# Altium footprint library Power_Lib_Altium.PcbLib: 383 footprints (part 10 of 24)
Each footprint in its own frame and in the unit in brackets; x right, y up, seen from the top. Pads: shape width x height; smd on the part's side, far side on the other; paste and mask are expansions set on the pad; w line width, h text height; cw(c..) or ccw(c..) is an arc to the next point about the centre after c.
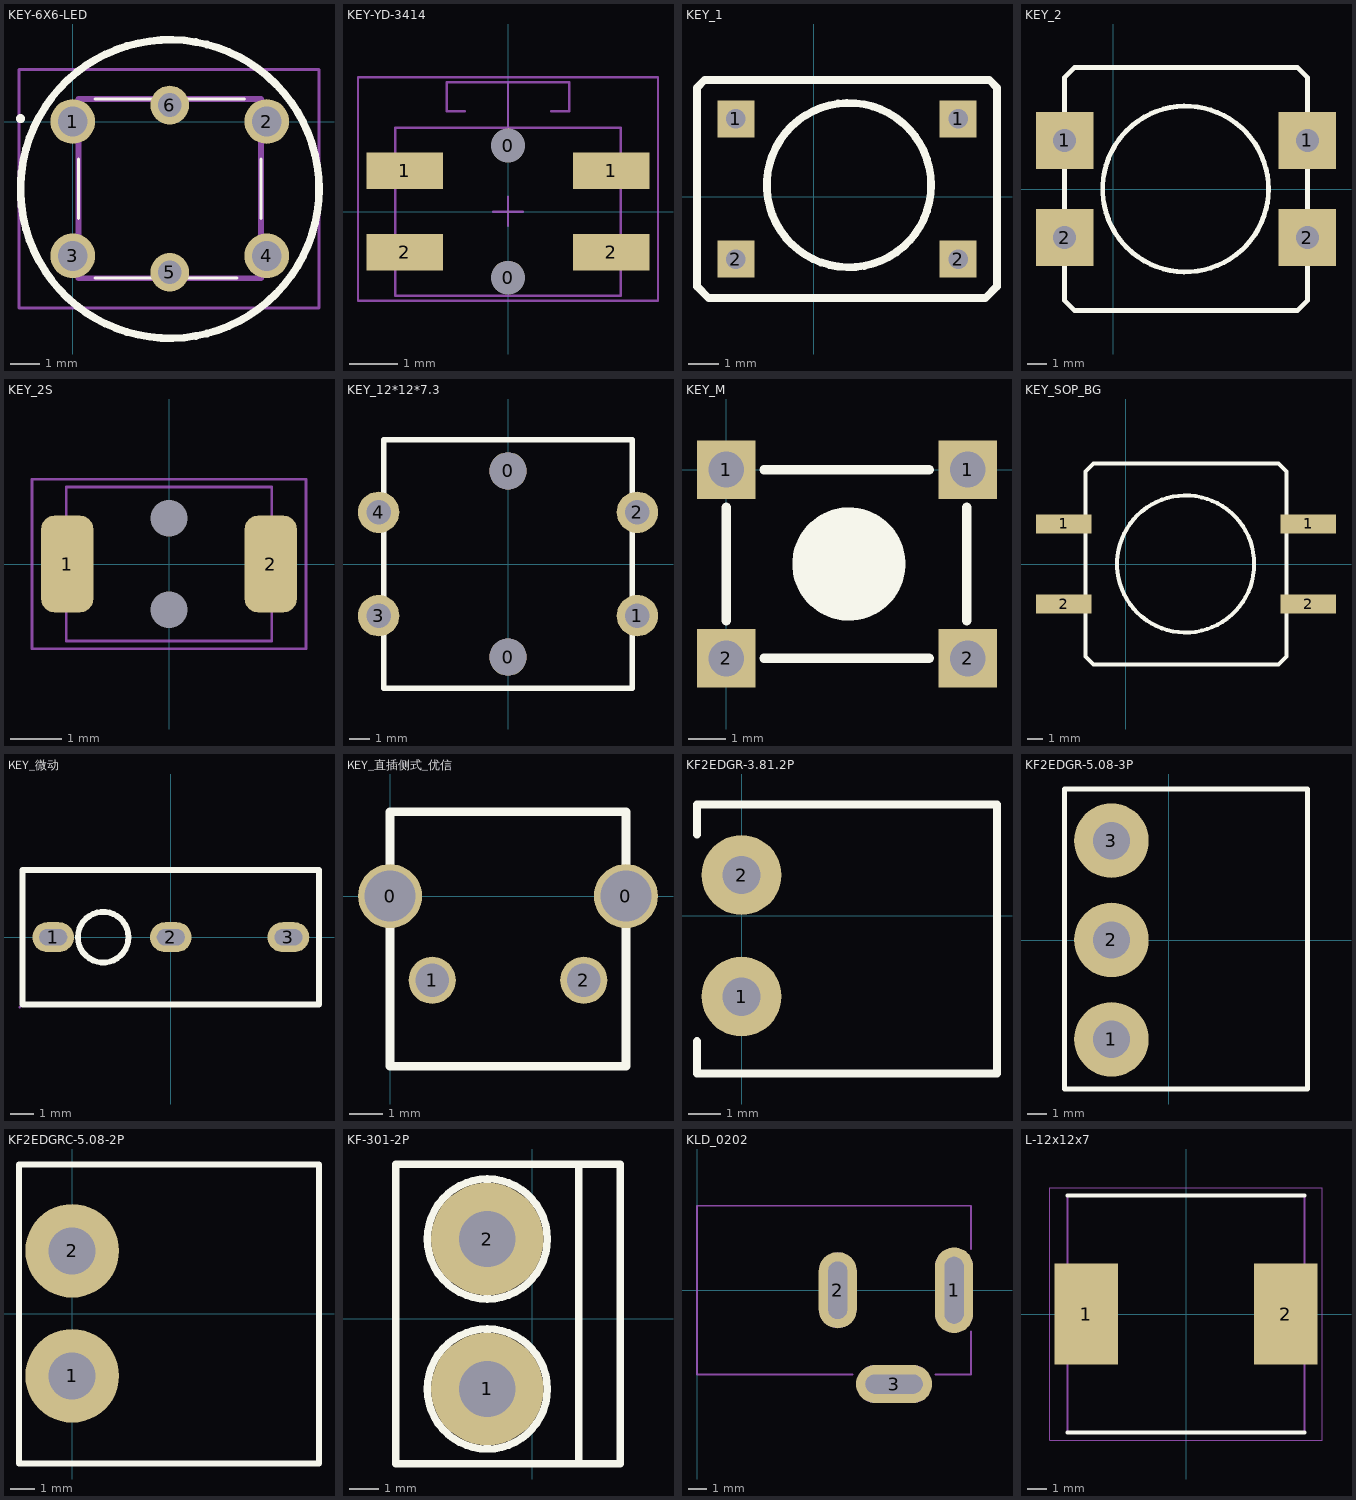
[diagram p9: the footprints below, top view; thin cyan lines are the x and y axes]

## KEY-6X6-LED [mm]
pads (6):
  round 1.5 hole 1: 1(0,0) 2(6.5,0) 3(0,-4.5) 4(6.5,-4.5)
  round 1.3 hole 0.8: 5(3.25,-5.05) 6(3.25,0.55)
Top Overlay:
  circle w0.254: c3.25,-2.261 r5
  lines w0.1: 0.2,-3.25 0.2,-1.25 0.2,-3.25 ; 0.75,-5.25 5.5,-5.25 0.75,-5.25 ; 0.75,0.75 5.75,0.75 0.75,0.75 ; 6.3,-3.25 6.3,-1.25 6.3,-3.25
  lines w0.2: -1.8,0.1 ccw(c-1.75,0.1) -1.7,0.1 ; -1.8,0.1 cw(c-1.75,0.1) -1.7,0.1 ; -1.8,0.1 ccw(c-1.75,0.1) -1.7,0.1
Mechanical 13:
  lines w0.2: 0.2,-5.25 0.2,0.75 6.3,0.75 6.3,-5.25 0.2,-5.25
Mechanical 15:
  lines w0.1: -1.8,-6.25 -1.8,1.75 8.25,1.75 8.25,-6.25 -1.8,-6.25

## KEY-YD-3414 [mm]
pads (6):
  round 0.7 hole 0.7 mask+0: 0(0,-1.375) 0(0,1.375)
  rect 1.6x0.762 smd: 1(-2.15,0.85) 1(2.15,0.85) 2(-2.15,-0.85) 2(2.15,-0.85)
Mechanical 13:
  lines w0.051: -0.899,2.089 -1.28,2.089 -1.28,2.689 1.28,2.689 1.28,2.089 0.899,2.089 ; -0.305,0 0.305,0 ; 0,-0.293 0,0.305 ; 0,1.739 0,2.689 ; -2.35,-1.75 2.35,-1.75 2.35,1.75 -2.35,1.75 -2.35,-1.75
Mechanical 14:
  lines w0.051: -3.124,-1.854 3.124,-1.854 3.124,2.794 -3.124,2.794 -3.124,-1.854
3D body "User Library-KMS231G.STEP": height 1.42, standoff -0.02, extent -2.339,-1.775 2.261,1.775

## KEY_1 [mm] "KEY?"
height 5
pads (4):
  rect 1.2x1.2 hole 0.635: 1(-2.54,2.54) 1(4.699,2.54) 2(-2.54,-2.032) 2(4.699,-2.032)
Top Overlay:
  circle w0.254: c1.143,0.381 r2.679
  lines w0.254: -3.81,3.048 -3.81,3.556 -3.556,3.81 ; -3.81,3.302 -3.81,-2.921 -3.429,-3.302 5.588,-3.302 5.969,-2.921 5.969,3.556 5.715,3.81 -3.556,3.81 ; -2.921,3.81 -3.556,3.81

## KEY_2 [mm] "KEY?"
pads (4):
  rect 3x3 hole 1.2: 1(-2.54,2.54) 1(10.16,2.54) 2(-2.54,-2.54) 2(10.16,-2.54)
Top Overlay:
  circle w0.254: c3.788,0 r4.34
  lines w0.254: 7.747,6.35 9.652,6.35 10.16,5.842 10.16,-5.842 9.652,-6.35 -2.032,-6.35 -2.54,-5.842 -2.54,5.842 -2.032,6.35 0.127,6.35 8.509,6.35

## KEY_2S [mil]
height 78.74
pads (4):
  round 0 hole 28: 0(0,-35) 0(0,35)
  rrect50% 40x74 smd: 1(-78,0) 2(78,0)
Mechanical 13:
  lines w2: -78.73,-59.05 78.75,-59.05 78.75,59.06 -78.74,59.06 -78.74,-59.06
Mechanical 14:
  lines w2: -105,-65 -105,65 105,65 105,-65 -105,-65
3D body "20041.stp": height 62.99, standoff 0, extent -78.73,-49.2 78.75,49.22

## KEY_12*12*7.3 [mm] "轻触开关 B3F-4055"
height 9
pads (6):
  round 1.8 hole 1.8: 0(0,-4.5) 0(0,4.5)
  round 2 hole 1.2: 1(6.25,-2.5) 2(6.25,2.5) 3(-6.25,-2.5) 4(-6.25,2.5)
Top Overlay:
  lines w0.254: -6,-6 -6,6 6,6 6,-6 -6,-6
3D body: height 3.5, standoff 0, extent -6,-6 6,6
3D body: height 5, standoff 3.5, extent -3.8,-3.8 3.8,3.8
3D body: height 9, standoff 5, extent -5.959,-6.023 6.041,5.977

## KEY_M [mil] "KEY_MID"
pads (4):
  rect 62x62 hole 38: 1(0,0) 1(255.91,0) 2(0,-200) 2(255.91,-200)
Top Overlay:
  circle w60: c130,-100 r30
  lines w10: -0.03,-160 -0.03,-40 ; 39.97,-200 215,-200 ; 39.97,0 215,0 ; 255,-160 255,-40

## KEY_SOP_BG [mm] "KEY?"
height 5
pads (4):
  rect 3.5x1.2 smd: 1(-3.937,2.54) 1(11.557,2.54) 2(-3.937,-2.54) 2(11.557,-2.54)
Top Overlay:
  circle w0.254: c3.788,0 r4.34
  lines w0.254: 7.747,6.35 9.652,6.35 10.16,5.842 10.16,-5.842 9.652,-6.35 -2.032,-6.35 -2.54,-5.842 -2.54,5.842 -2.032,6.35 0.127,6.35 8.509,6.35

## KEY_微动 [mm] "KEY_微动"
height 5
pads (3):
  oval 1.8x1.3 hole 0.7 slot 1.2 at 0 deg: 1(-5.08,0) 2(0,0) 3(5.08,0)
Top Overlay:
  circle w0.254: c-2.921,0 r1.092
  lines w0.254: -6.4,-2.9 -6.4,2.9 6.4,2.9 6.4,-2.9 -6.4,-2.9
Mechanical 5:
  region: 4.83,0.28 5.33,0.28 5.33,-0.28 4.83,-0.28
  region: -0.25,0.28 0.25,0.28 0.25,-0.28 -0.25,-0.28
  region: -5.33,0.28 -4.83,0.28 -4.83,-0.28 -5.33,-0.28
Mechanical 6:
  circle w0.06: c-6.527,-3.027 r0.03
Mechanical 15:
  lines w0.003: -0.04,0.51 0.01,0.561

## KEY_直插侧式_优信 [mm]
pads (4):
  round 1.9 hole 1.5: 0(0,0) 0(7,0)
  round 1.4 hole 1: 1(1.25,-2.5) 2(5.75,-2.5)
Top Overlay:
  lines w0.254: 0,-5.05 1.25,-5.05 5.75,-5.05 7,-5.05 7,2.5 0,2.5 0,-5.05

## KF2EDGR-3.81.2P [mm]
pads (2):
  round 2.5 hole 1.2: 1(0,-2.54) 2(0,1.27)
Top Overlay:
  lines w0.254: -1.397,-3.937 -1.397,-4.953 8.001,-4.953 8.001,3.484 -1.397,3.484 -1.397,2.54 ; 0,0.508 0,0.889
3D body "KF2EDGR-3.81-2P.stp": height 7.1, standoff -3.17, extent -1.298,-4.826 7.902,3.484

## KF2EDGR-5.08-3P [mil]
pads (3):
  round 150 hole 75: 1(-115,-199) 2(-115,1) 3(-115,201)
Top Overlay:
  lines w10: -210,-299 -210,305 280,305 280,-299 -210,-299
3D body "User Library-MSTB 2,5-3-G-5,08 1759020.STEP": height 338.58, standoff -137.8, extent -195,-300 277.53,300

## KF2EDGRC-5.08-2P [mil]
pads (2):
  round 150 hole 75: 1(0,-99) 2(0,101)
Top Overlay:
  lines w10: -85,-239.37 -85,239.36 395,239.36 395,-239.37 -85,-239.37
3D body "14043.step": height 322.83, standoff -153.54, extent -80,-239.37 392.53,239.37

## KF-301-2P [mil]
pads (2):
  round 150 hole 75: 1(-60,-94) 2(-60,106)
Top Overlay:
  circle w10: c-60,106 r80
  circle w10: c-60,-94 r80
  lines w10: -60,-174 -60,-159 ; -60,-29 -60,-14 ; -60,26 -60,41 ; -60,171 -60,186 ; 62.05,-194 62.05,206 ; -182.05,-194 -182.05,206 117.17,206 117.17,-194 -182.05,-194
3D body "User Library-Terminal-Screw-3A-2way.SLDPRT": height 393.7, standoff -118.11, extent -181.61,-203.84 117.61,213.48

## KLD_0202 [mil]
pads (3):
  oval 80x180 hole 40 slot 140 at 90 deg: 1(539.37,0)
  oval 80x160 hole 40 slot 120 at 90 deg: 2(295.28,0)
  oval 160x80 hole 40 slot 120 at 0 deg: 3(413.39,-196.85)
Mechanical 2:
  lines w79.37: 295.28,-39.37 295.28,39.37 ; 374.02,-196.85 452.76,-196.85 ; 539.37,-49.21 539.37,49.21
Mechanical 13:
  lines w4: 326.77,-177.17 0,-177.17 0,177.17 574.8,177.17 574.8,86.61 ; 500,-177.17 574.8,-177.17 574.8,-86.61
3D body "User Library-K375A -PCM DC Power Jack 2mm Pin.STEP": height 433.07, standoff -200.79, extent -9.25,-212.75 561.62,173.07

## L-12x12x7 [mm]
pads (2):
  rect 3.2x5.1 smd: 1(-5.05,0) 2(5.05,0)
Top Overlay:
  lines w0.2: -6,-6 6,-6 ; -6,6 6,6
Mechanical 13:
  lines w0.1: -6,-6 -6,6 6,6 6,-6 -6,-6
Mechanical 15:
  lines w0.05: -6.9,-6.4 -6.9,6.4 6.9,6.4 6.9,-6.4 -6.9,-6.4
3D body "CDRH127NP-4R7NC.stp": height 8, standoff 0, extent -6,-6 6,6